# Altium integrated library Jesse_Library.IntLib: 1084 symbols (part 2 of 5) (continued)
## IC USBUF02W6 (continued)
USB ESD; Package: SOIC-8_150mil; Supplier: LC; SuppliersPartNumber: C9669; ComponentLink1Description: 立创商城链接; ComponentLink1URL: https://item.szlcsc.com/76058.html
footprint SOT23-6
pins: 1 D1, 2 GND, 3 D2, 4 D3, 5 VCC, 6 D4

## IC W25Q16JVSSIQ
designator U?, comment W25Q16JVSSIQ
Flash ROM; Package: SOIC-8; Supplier: LC; SuppliersPartNumber: C35101; ComponentLink1Description: 立创商城链接; ComponentLink1URL: https://item.szlcsc.com/83474.html
footprint SOIC8_208mil
pins: 1 ~{CS}, 2 DO, 3 ~{WP}, 4 GND, 5 DI, 6 CLK, 7 ~{HOLD} ro ~{RESET}, 8 VCC

## IC W25Q128FVSIG
designator U?
Flash ROM; ComponentLink1Description: 供应商链接; ComponentLink1URL: http://www.szlcsc.com/product/details_36072.html; Package: SOIC-8; Supplier: LC; SuppliersPartNumber: C35101
footprint SOIC8_208mil
pins: 1 ~{CS}, 2 DO, 3 ~{WP}, 4 GND, 5 DI, 6 CLK, 7 ~{HOLD} ro ~{RESET}, 8 VCC

## IC W5500
designator U?
以太网; ComponentLink1Description: 供应商链接; ComponentLink1URL: http://www.szlcsc.com/product/details_33808.html; Package: LQFP-48_7x7x05P; Supplier: LC; SuppliersPartNumber: C32843
footprint LQFP48 7x7
pins: 1 TXN, 2 TXP, 3 AGND, 4 AVDD, 5 RXN, 6 RXP, 7 DNC, 8 AVDD, 9 AGND, 10 EXRES1, 11 AVDD, 12 NC, 13 NC, 14 AGND, 15 AVDD, 16 AGND, 17 AVDD, 18 VBG, 19 AGND, 20 TOCAP, 21 AVDD, 22 1V2O, 23 RSVD, 24 SPDLED, 25 LINKLED, 26 DUPLED, 27 ACTLED, 28 VDD, 29 GND, 30 XI/CLCKIN, 31 XO, 32 SCSn, 33 SCLK, 34 MISO, 35 MOSI, 36 INTn, 37 RSTn, 38 RSVD, 39 RSVD, 40 RSVD, 41 RSVD, 42 RSVD, 43 PMODE2, 44 PMODE1, 45 PMODE0, 46 NC, 47 NC, 48 AGND

## IC XL1509-5.0E1
designator U?
DC-DC芯片; ComponentLink1Description: 供应商链接; ComponentLink1URL: http://www.szlcsc.com/product/details_62115.html; Package: SOP-8_150mil; Supplier: LC; SuppliersPartNumber: C61063
footprint SOP8_150mil
pins: 1 VIN , 2 OUTPUT , 3 FEEDBACK , 4 ON/OFF , 5  GND, 6  GND, 7 GND, 8 GND

## IC XL1509-ADJE1
designator U?
DC-DC芯片; ComponentLink1Description: 供应商链接; ComponentLink1URL: http://www.szlcsc.com/product/details_75311.html; Package: SOP-8_150mil; Supplier: LC; SuppliersPartNumber: C74192
footprint SOP8_150mil
pins: 1 VIN , 2 OUTPUT , 3 FEEDBACK , 4 ON/OFF , 5  GND, 6  GND, 7 GND, 8 GND

## IC XL6006E1
designator U?
LED升压型驱动; ComponentLink1Description: 供应商链接; ComponentLink1URL: http://www.szlcsc.com/product/details_10538.html; Package: TO-263-5; Supplier: LC; SuppliersPartNumber: C10002
footprint TO263-5A (263，5脚晶体管)
pins: 1 GND (power), 2 EN (power), 3 SW (power), 4 VIN (in), 5 FB


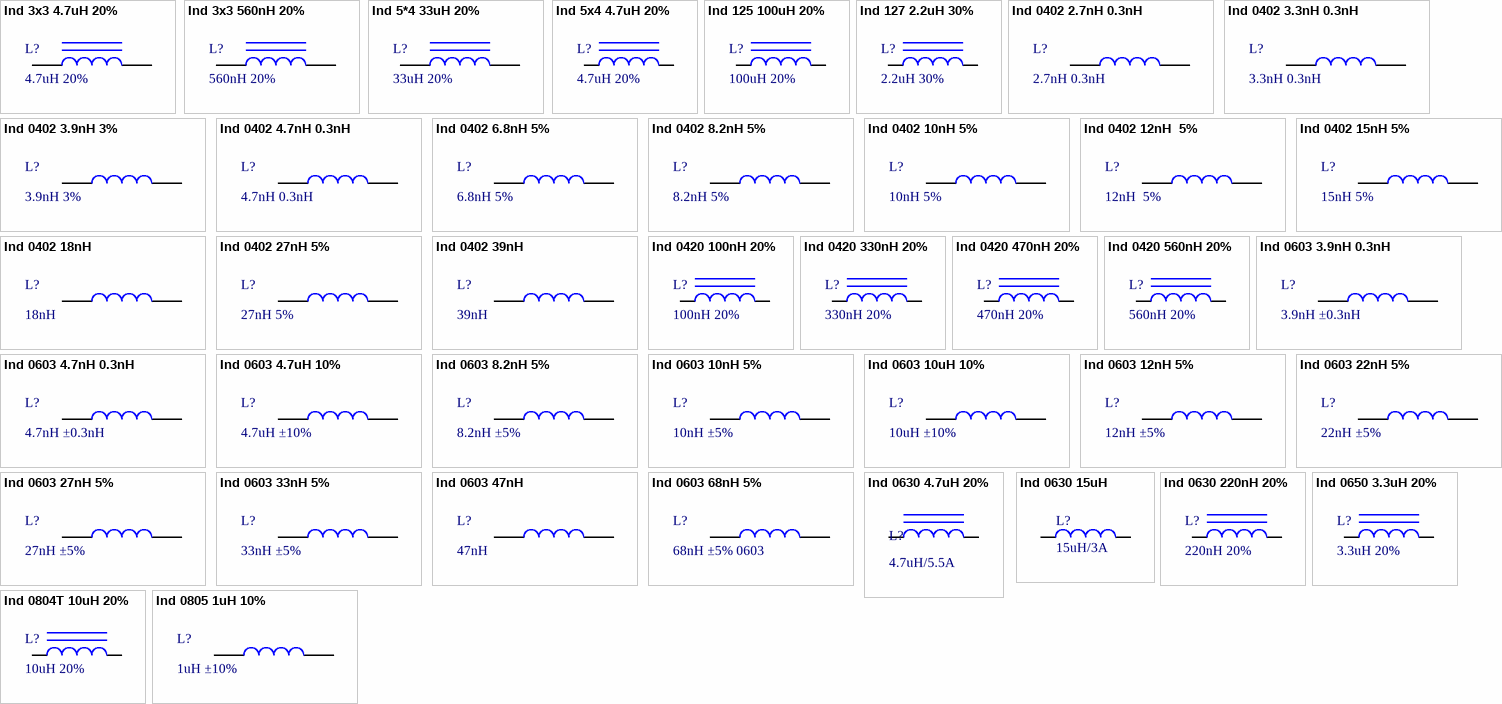
[diagram p20: symbols Ind 3x3 4.7uH 20% to Ind 0805 1uH 10%]

## Ind 3x3 4.7uH 20%
designator L?, comment 4.7uH 20%
贴片功率电感
footprint IND3x3
pins: 1, 2

## Ind 3x3 560nH 20%
designator L?, comment 560nH 20%
贴片功率电感
footprint IND3x3
pins: 1, 2

## Ind 5*4 33uH 20%
designator L?, comment 33uH 20%
贴片功率电感
footprint IND5X4
pins: 1, 2

## Ind 5x4 4.7uH 20%
designator L?, comment 4.7uH 20%
贴片功率电感
footprint IND5x4
pins: 1, 2

## Ind 125 100uH 20%
designator L?, comment 100uH 20%
贴片功率电感
footprint 1205_L (Footprint not found)
pins: 1, 2

## Ind 127 2.2uH 30%
designator L?, comment 2.2uH 30%
贴片功率电感
footprint 1207_L (Footprint not found)
pins: 1, 2

## Ind 0402 2.7nH 0.3nH
designator L?, comment 2.7nH 0.3nH
贴片电感; ComponentLink1Description: 供应商链接; ComponentLink1URL: http://www.szlcsc.com/product/details_27872.html; Package: 0402; Supplier: LC; SuppliersPartNumber: C27123
footprint 0402_L
pins: 1, 2

## Ind 0402 3.3nH 0.3nH
designator L?, comment 3.3nH 0.3nH
贴片电感; ComponentLink1Description: 供应商链接; ComponentLink1URL: http://www.szlcsc.com/product/details_27873.html; Package: 0402; Supplier: LC; SuppliersPartNumber: C27124
footprint 0402_L
pins: 1, 2

## Ind 0402 3.9nH 3%
designator L?, comment 3.9nH 3%
贴片电感; ComponentLink1Description: 供应商链接; ComponentLink1URL: http://www.szlcsc.com/product/details_14690.html; Package: 0402; Supplier: LC; SuppliersPartNumber: C14033
footprint 0402_L
pins: 1, 2

## Ind 0402 4.7nH 0.3nH
designator L?, comment 4.7nH 0.3nH
贴片电感; ComponentLink1Description: 供应商链接; ComponentLink1URL: http://www.szlcsc.com/product/details_14246.html; Package: 0402; Supplier: LC; SuppliersPartNumber: C13595
footprint 0402_L
pins: 1, 2

## Ind 0402 6.8nH 5%
designator L?, comment 6.8nH 5%
贴片电感; ComponentLink1Description: 供应商链接; ComponentLink1URL: http://www.szlcsc.com/product/details_33003.html; Package: 0402; Supplier: LC; SuppliersPartNumber: C32041
footprint 0402_L
pins: 1, 2

## Ind 0402 8.2nH 5%
designator L?, comment 8.2nH 5%
贴片电感; ComponentLink1Description: 供应商链接; ComponentLink1URL: http://www.szlcsc.com/product/details_16890.html; Package: 0402; Supplier: LC; SuppliersPartNumber: C16208
footprint 0402_L
pins: 1, 2

## Ind 0402 10nH 5%
designator L?, comment 10nH 5%
贴片电感; ComponentLink1Description: 供应商链接; ComponentLink1URL: http://www.szlcsc.com/product/details_27896.html; Package: 0402; Supplier: LC; SuppliersPartNumber: C27147
footprint 0402_L
pins: 1, 2

## Ind 0402 12nH  5%
designator L?, comment 12nH  5%
贴片电感; ComponentLink1Description: 供应商链接; ComponentLink1URL: http://www.szlcsc.com/product/details_25303.html; Package: 0402; Supplier: LC; SuppliersPartNumber: C24563
footprint 0402_L
pins: 1, 2

## Ind 0402 15nH 5%
designator L?, comment 15nH 5%
贴片电感; ComponentLink1Description: 供应商链接; ComponentLink1URL: http://www.szlcsc.com/product/details_27892.html; Package: 0402; Supplier: LC; SuppliersPartNumber: C27143
footprint 0402_L
pins: 1, 2

## Ind 0402 18nH
designator L?, comment 18nH
贴片电感; ComponentLink1Description: 供应商链接; ComponentLink1URL: http://www.szlcsc.com/product/details_25302.html; Package: 0402; Supplier: LC; SuppliersPartNumber: C24562
footprint 0402_L
pins: 1, 2

## Ind 0402 27nH 5%
designator L?, comment 27nH 5%
贴片电感; ComponentLink1Description: 供应商链接; ComponentLink1URL: http://www.szlcsc.com/product/details_19533.html; Package: 0402; Supplier: LC; SuppliersPartNumber: C18830
footprint 0402_L
pins: 1, 2

## Ind 0402 39nH
designator L?, comment 39nH
贴片电感; ComponentLink1Description: 供应商链接; ComponentLink1URL: http://www.szlcsc.com/product/details_27187.html; Package: 0402; Supplier: LC; SuppliersPartNumber: C26443
footprint 0402_L
pins: 1, 2

## Ind 0420 100nH 20%
designator L?, comment 100nH 20%
贴片功率电感
footprint 0420_L
pins: 1, 2

## Ind 0420 330nH 20%
designator L?, comment 330nH 20%
贴片功率电感
footprint 0420_L
pins: 1, 2

## Ind 0420 470nH 20%
designator L?, comment 470nH 20%
贴片功率电感
footprint 0420_L
pins: 1, 2

## Ind 0420 560nH 20%
designator L?, comment 560nH 20%
贴片功率电感
footprint 0420_L
pins: 1, 2

## Ind 0603 3.9nH 0.3nH
designator L?, comment 3.9nH ±0.3nH
贴片电感; ComponentLink1Description: 供应商链接; ComponentLink1URL: http://www.szlcsc.com/product/details_14473.html; Package: 0603; Supplier: LC; SuppliersPartNumber: C13818
footprint 0603_L
pins: 1, 2

## Ind 0603 4.7nH 0.3nH
designator L?, comment 4.7nH ±0.3nH
贴片电感; ComponentLink1Description: 供应商链接; ComponentLink1URL: http://www.szlcsc.com/product/details_1382.html; Package: 0603; Supplier: LC; SuppliersPartNumber: C1030
footprint 0603_L
pins: 1, 2

## Ind 0603 4.7uH 10%
designator L?, comment 4.7uH ±10%
贴片电感; ComponentLink1Description: 供应商链接; ComponentLink1URL: http://www.szlcsc.com/product/details_1386.html; Package: 0603; Supplier: LC; SuppliersPartNumber: C1034
footprint 0603_L
pins: 1, 2

## Ind 0603 8.2nH 5%
designator L?, comment 8.2nH ±5%
贴片电感; ComponentLink1Description: 供应商链接; ComponentLink1URL: http://www.szlcsc.com/product/details_1384.html; Package: 0603; Supplier: LC; SuppliersPartNumber: C1032
footprint 0603_L
pins: 1, 2

## Ind 0603 10nH 5%
designator L?, comment 10nH ±5%
贴片电感; ComponentLink1Description: 供应商链接; ComponentLink1URL: http://www.szlcsc.com/product/details_16347.html; Package: 0603; Supplier: LC; SuppliersPartNumber: C15666
footprint 0603_L
pins: 1, 2

## Ind 0603 10uH 10%
designator L?, comment 10uH ±10%
贴片电感; ComponentLink1Description: 供应商链接; ComponentLink1URL: http://www.szlcsc.com/product/details_1387.html; Package: 0603; Supplier: LC; SuppliersPartNumber: C1035
footprint 0603_L
pins: 1, 2

## Ind 0603 12nH 5%
designator L?, comment 12nH ±5%
贴片电感; ComponentLink1Description: 供应商链接; ComponentLink1URL: http://www.szlcsc.com/product/details_30010.html; Package: 0603; Supplier: LC; SuppliersPartNumber: C29258
footprint 0603_L
pins: 1, 2

## Ind 0603 22nH 5%
designator L?, comment 22nH ±5%
贴片电感; ComponentLink1Description: 供应商链接; ComponentLink1URL: http://www.szlcsc.com/product/details_12684.html; Package: 0603; Supplier: LC; SuppliersPartNumber: C12099
footprint 0603_L
pins: 1, 2

## Ind 0603 27nH 5%
designator L?, comment 27nH ±5%
贴片电感; ComponentLink1Description: 供应商链接; ComponentLink1URL: http://www.szlcsc.com/product/details_12685.html; Package: 0603; Supplier: LC; SuppliersPartNumber: C12100
footprint 0603_L
pins: 1, 2

## Ind 0603 33nH 5%
designator L?, comment 33nH ±5%
贴片电感; ComponentLink1Description: 供应商链接; ComponentLink1URL: http://www.szlcsc.com/product/details_36021.html; Package: 0603; Supplier: LC; SuppliersPartNumber: C35050
footprint 0603_L
pins: 1, 2

## Ind 0603 47nH
designator L?, comment 47nH
贴片电感; ComponentLink1Description: 供应商链接; ComponentLink1URL: http://www.szlcsc.com/product/details_30437.html; Package: 0603; Supplier: LC; SuppliersPartNumber: C29683
footprint 0603_L
pins: 1, 2

## Ind 0603 68nH 5%
designator L?, comment 68nH ±5% 0603
贴片电感; ComponentLink1Description: 供应商链接; ComponentLink1URL: http://www.szlcsc.com/product/details_14064.html; Package: 0603; Supplier: LC; SuppliersPartNumber: C13415
footprint 0603_L
pins: 1, 2

## Ind 0630 4.7uH 20%
designator L?, comment 4.7uH/5.5A
贴片电感; Code_IEC: 1005; Published: 8-Jun-2000; LatestRevisionDate: 29-May-2009; LatestRevisionNote: IPC-7351 Footprint Added.; PackageReference: 0402-A; Publisher: Altium Limited; PackageDescription: Chip Inductor; Code_JEITA: 0402
footprint 0630_L
pins: 1, 2

## Ind 0630 15uH
designator L?, comment 15uH/3A
贴片电感; Code_IEC: 1005; Published: 8-Jun-2000; LatestRevisionDate: 29-May-2009; LatestRevisionNote: IPC-7351 Footprint Added.; PackageReference: 0402-A; Publisher: Altium Limited; PackageDescription: Chip Inductor; Code_JEITA: 0402
footprint 0630_L
pins: 1, 2

## Ind 0630 220nH 20%
designator L?, comment 220nH 20%
贴片功率电感
footprint 0630_L
pins: 1, 2

## Ind 0650 3.3uH 20%
designator L?, comment 3.3uH 20%
贴片功率电感
footprint 0650_L
pins: 1, 2

## Ind 0804T 10uH 20%
designator L?, comment 10uH 20%
贴片功率电感
footprint 0804T_L (功率电感)
pins: 1, 2

## Ind 0805 1uH 10%
designator L?, comment 1uH ±10%
贴片电感; ComponentLink1Description: 供应商链接; ComponentLink1URL: http://www.szlcsc.com/product/details_1394.html; Package: 0805; Supplier: LC; SuppliersPartNumber: C1042
footprint 0805_L
pins: 1, 2

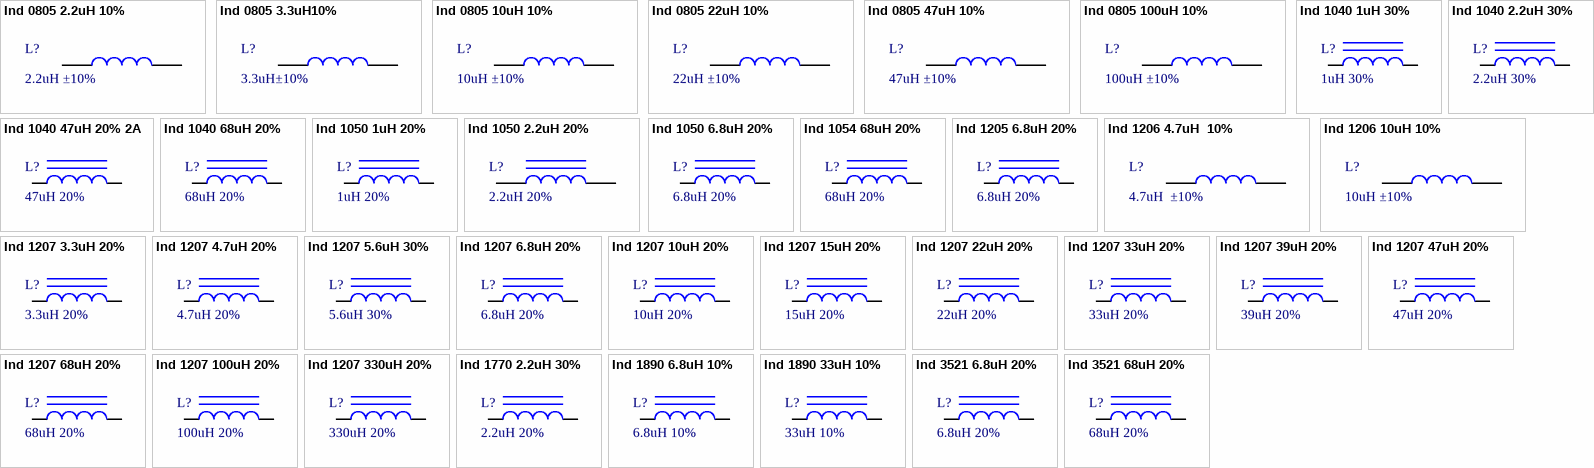
[diagram p21: symbols Ind 0805 2.2uH 10% to Ind 3521 68uH 20%]

## Ind 0805 2.2uH 10%
designator L?, comment 2.2uH ±10%
贴片电感; ComponentLink1Description: 供应商链接; ComponentLink1URL: http://www.szlcsc.com/product/details_1395.html; Package: 0805; Supplier: LC; SuppliersPartNumber: C1043
footprint 0805_L
pins: 1, 2

## Ind 0805 3.3uH10%
designator L?, comment 3.3uH±10%
贴片电感; ComponentLink1Description: 供应商链接; ComponentLink1URL: http://www.szlcsc.com/product/details_52738.html; Package: 0805; Supplier: LC; SuppliersPartNumber: C51725
footprint 0805_L
pins: 1, 2

## Ind 0805 10uH 10%
designator L?, comment 10uH ±10%
贴片电感; ComponentLink1Description: 供应商链接; ComponentLink1URL: http://www.szlcsc.com/product/details_1398.html; Package: 0805; Supplier: LC; SuppliersPartNumber: C1046
footprint 0805_L
pins: 1, 2

## Ind 0805 22uH 10%
designator L?, comment 22uH ±10%
贴片电感; ComponentLink1Description: 供应商链接; ComponentLink1URL: http://www.szlcsc.com/product/details_33340.html; Package: 0805; Supplier: LC; SuppliersPartNumber: C32375
footprint 0805_L
pins: 1, 2

## Ind 0805 47uH 10%
designator L?, comment 47uH ±10%
贴片电感; ComponentLink1Description: 供应商链接; ComponentLink1URL: http://www.szlcsc.com/product/details_14964.html; Package: 0805; Supplier: LC; SuppliersPartNumber: C14304
footprint 0805_L
pins: 1, 2

## Ind 0805 100uH 10%
designator L?, comment 100uH ±10%
贴片电感; ComponentLink1Description: 供应商链接; ComponentLink1URL: http://www.szlcsc.com/product/details_69137.html; Package: 0805; Supplier: LC; SuppliersPartNumber: C68035
footprint 0805_L
pins: 1, 2

## Ind 1040 1uH 30%
designator L?, comment 1uH 30%
贴片功率电感
footprint 1040_L
pins: 1, 2

## Ind 1040 2.2uH 30%
designator L?, comment 2.2uH 30%
贴片功率电感
footprint 1040_L
pins: 1, 2

## Ind 1040 47uH 20% 2A
designator L?, comment 47uH 20%
贴片功率电感
footprint 1040_L
pins: 1, 2

## Ind 1040 68uH 20%
designator L?, comment 68uH 20%
贴片功率电感
footprint 1040_L
pins: 1, 2

## Ind 1050 1uH 20%
designator L?, comment 1uH 20%
贴片功率电感
footprint 1050_L
pins: 1, 2

## Ind 1050 2.2uH 20%
designator L?, comment 2.2uH 20%
贴片功率电感
footprint 1050_L
pins: 1, 2

## Ind 1050 6.8uH 20%
designator L?, comment 6.8uH 20%
贴片功率电感
footprint 1050_L
pins: 1, 2

## Ind 1054 68uH 20%
designator L?, comment 68uH 20%
贴片功率电感
footprint 1054_L
pins: 1, 2

## Ind 1205 6.8uH 20%
designator L?, comment 6.8uH 20%
贴片功率电感
footprint 1205_L
pins: 1, 2

## Ind 1206 4.7uH  10%
designator L?, comment 4.7uH  ±10%
贴片电感; ComponentLink1Description: 供应商链接; ComponentLink1URL: http://www.szlcsc.com/product/details_1401.html; Package: 1206; Supplier: LC; SuppliersPartNumber: C1049
footprint 1206_L
pins: 1, 2

## Ind 1206 10uH 10%
designator L?, comment 10uH ±10%
贴片电感; ComponentLink1Description: 供应商链接; ComponentLink1URL: http://www.szlcsc.com/product/details_1403.html; Package: 1206; Supplier: LC; SuppliersPartNumber: C1051
footprint 1206_L
pins: 1, 2

## Ind 1207 3.3uH 20%
designator L?, comment 3.3uH 20%
贴片功率电感
footprint 1207_L
pins: 1, 2

## Ind 1207 4.7uH 20%
designator L?, comment 4.7uH 20%
贴片功率电感
footprint 1207_L
pins: 1, 2

## Ind 1207 5.6uH 30%
designator L?, comment 5.6uH 30%
贴片功率电感
footprint 1207_L
pins: 1, 2

## Ind 1207 6.8uH 20%
designator L?, comment 6.8uH 20%
贴片功率电感
footprint 1207_L
pins: 1, 2

## Ind 1207 10uH 20%
designator L?, comment 10uH 20%
贴片功率电感
footprint 1207_L
pins: 1, 2

## Ind 1207 15uH 20%
designator L?, comment 15uH 20%
贴片功率电感
footprint 1207_L
pins: 1, 2

## Ind 1207 22uH 20%
designator L?, comment 22uH 20%
贴片功率电感
footprint 1207_L
pins: 1, 2

## Ind 1207 33uH 20%
designator L?, comment 33uH 20%
贴片功率电感
footprint 1207_L
pins: 1, 2

## Ind 1207 39uH 20%
designator L?, comment 39uH 20%
贴片功率电感
footprint 1207_L
pins: 1, 2

## Ind 1207 47uH 20%
designator L?, comment 47uH 20%
贴片功率电感
footprint 1207_L
pins: 1, 2

## Ind 1207 68uH 20%
designator L?, comment 68uH 20%
贴片功率电感
footprint 1207_L
pins: 1, 2

## Ind 1207 100uH 20%
designator L?, comment 100uH 20%
贴片功率电感
footprint 1207_L
pins: 1, 2

## Ind 1207 330uH 20%
designator L?, comment 330uH 20%
贴片功率电感
footprint 1207_L
pins: 1, 2

## Ind 1770 2.2uH 30%
designator L?, comment 2.2uH 20%
贴片功率电感
footprint 1770_L
pins: 1, 2

## Ind 1890 6.8uH 10%
designator L?, comment 6.8uH 10%
贴片功率电感
footprint 1890_L (18X18)
pins: 1, 2

## Ind 1890 33uH 10%
designator L?, comment 33uH 10%
贴片功率电感
footprint 1890_L (18X18)
pins: 1, 2

## Ind 3521 6.8uH 20%
designator L?, comment 6.8uH 20%
贴片功率电感
footprint 3521_L
pins: 1, 2

## Ind 3521 68uH 20%
designator L?, comment 68uH 20%
贴片功率电感
footprint 3521_L
pins: 1, 2


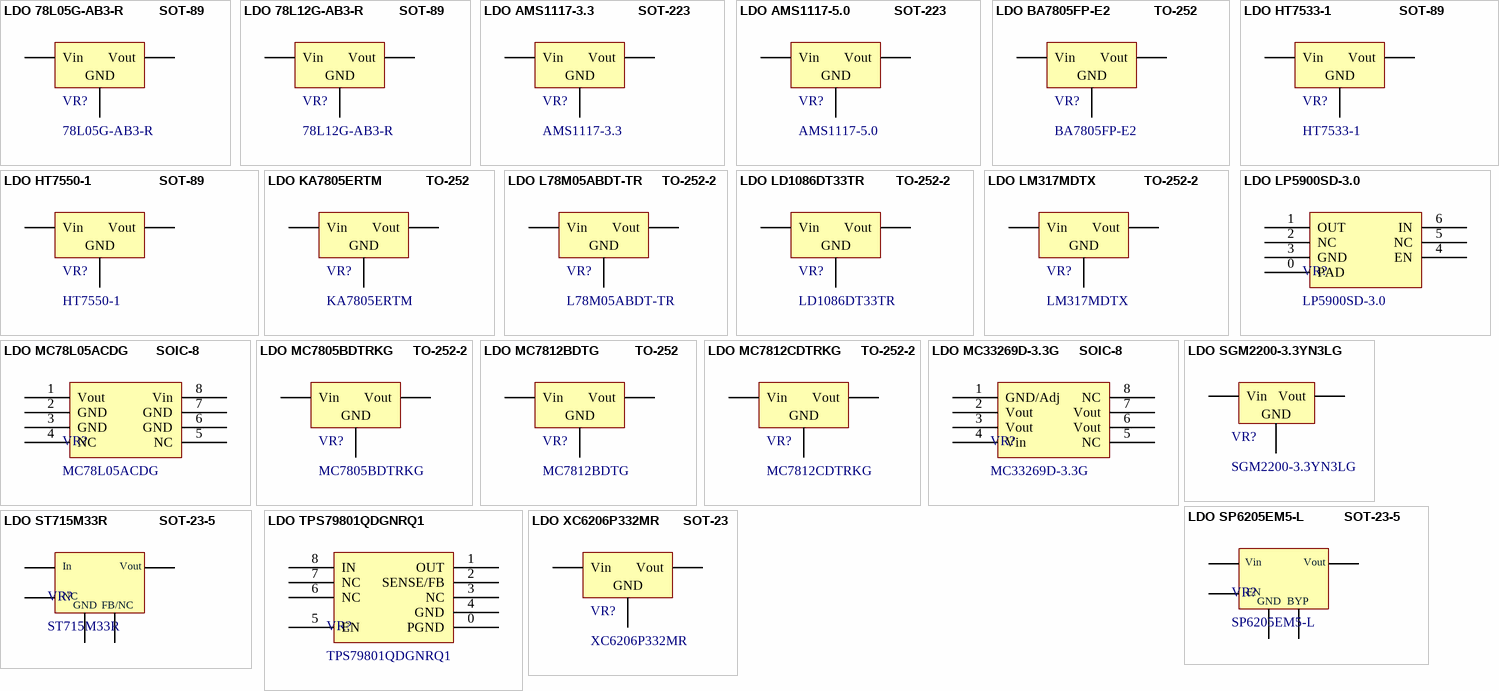
[diagram p22: symbols LDO 78L05G-AB3-R         SOT-89 to LDO XC6206P332MR      SOT-23]

## LDO 78L05G-AB3-R         SOT-89
designator VR?, comment 78L05G-AB3-R
低压差线性稳压(LDO); Package: SOT-89; Supplier: LC; SuppliersPartNumber: C71136; ComponentLink1Description: 立创商城链接; ComponentLink1URL: https://item.szlcsc.com/72235.html
footprint SOT89-3
pins: 1 Vout, 2 GND, 3 Vin

## LDO 78L12G-AB3-R         SOT-89
designator VR?, comment 78L12G-AB3-R
低压差线性稳压(LDO); Package: SOT-89; Supplier: LC; SuppliersPartNumber: C75501; ComponentLink1Description: 立创商城链接; ComponentLink1URL: https://item.szlcsc.com/76626.html
footprint SOT89-3
pins: 1 Vout, 2 GND, 3 Vin

## LDO AMS1117-3.3           SOT-223
designator VR?, comment AMS1117-3.3
低压差线性稳压(LDO); Package: SOT-223; Supplier: LC; SuppliersPartNumber: C6186; ComponentLink1Description: 立创商城链接; ComponentLink1URL: https://item.szlcsc.com/6652.html
footprint SOT223
pins: 1 GND, 2 Vout, 3 Vin

## LDO AMS1117-5.0           SOT-223
designator VR?, comment AMS1117-5.0
低压差线性稳压(LDO); Package: SOT-223; Supplier: LC; SuppliersPartNumber: C6187; ComponentLink1Description: 立创商城链接; ComponentLink1URL: https://item.szlcsc.com/6653.html
footprint SOT223
pins: 1 GND, 2 Vout, 3 Vin

## LDO BA7805FP-E2           TO-252
designator VR?, comment BA7805FP-E2
低压差线性稳压(LDO); Package: SOT-89; Supplier: LC; SuppliersPartNumber: C71136; ComponentLink1Description: 立创商城链接; ComponentLink1URL: https://item.szlcsc.com/80782.html
footprint TO252 (252晶体管)
pins: 1 Vin, 2 GND, 3 Vout

## LDO HT7533-1                 SOT-89
designator VR?, comment HT7533-1
低压差线性稳压(LDO); Package: SOT-89; Supplier: LC; SuppliersPartNumber: C14289; ComponentLink1Description: 立创商城链接; ComponentLink1URL: https://item.szlcsc.com/14949.html
footprint SOT89-3
pins: 1 GND, 2 Vin, 3 Vout

## LDO HT7550-1                 SOT-89
designator VR?, comment HT7550-1
低压差线性稳压(LDO); Package: SOT-89; Supplier: LC; SuppliersPartNumber: C16106; ComponentLink1Description: 立创商城链接; ComponentLink1URL: https://item.szlcsc.com/16788.html
footprint SOT89-3
pins: 1 GND, 2 Vin, 3 Vout

## LDO KA7805ERTM           TO-252
designator VR?, comment KA7805ERTM
低压差线性稳压(LDO); Package: SOT-89; Supplier: LC; SuppliersPartNumber: C71136; ComponentLink1Description: 立创商城链接; ComponentLink1URL: https://item.szlcsc.com/250123.html
footprint TO252 (252晶体管)
pins: 1 Vin, 2 GND, 3 Vout

## LDO L78M05ABDT-TR     TO-252-2
designator VR?, comment L78M05ABDT-TR
低压差线性稳压(LDO); Package: TO-252-2; Supplier: LC; SuppliersPartNumber: C58069; ComponentLink1Description: 立创商城链接; ComponentLink1URL: https://item.szlcsc.com/59107.html
footprint TO252 (252晶体管)
pins: 1 Vin, 2 GND, 3 Vout

## LDO LD1086DT33TR        TO-252-2
designator VR?, comment LD1086DT33TR
低压差线性稳压(LDO); Package: TO-252-2; Supplier: LC; SuppliersPartNumber: C75510; ComponentLink1Description: 立创商城链接; ComponentLink1URL: https://item.szlcsc.com/12615.html
footprint TO252 (252晶体管)
pins: 1 GND, 2 Vout, 3 Vin

## LDO LM317MDTX            TO-252-2
designator VR?, comment LM317MDTX
低压差线性稳压(LDO); Package: TO-252-2; Supplier: LC; SuppliersPartNumber: C75510; ComponentLink1Description: 立创商城链接; ComponentLink1URL: https://item.szlcsc.com/232561.html
footprint TO252 (252晶体管)
pins: 1 GND, 2 Vout, 3 Vin

## LDO LP5900SD-3.0
designator VR?, comment LP5900SD-3.0
低压差线性稳压(LDO); Package: SOT-23; Supplier: LC; SuppliersPartNumber: C5446
footprint WSON6 2.5X2.2
pins: 0 PAD, 1 OUT (power), 2 NC, 3 GND, 4 EN, 5 NC, 6 IN

## LDO MC78L05ACDG       SOIC-8
designator VR?, comment MC78L05ACDG
低压差线性稳压器(LDO); ComponentLink1Description: 立创商城链接; ComponentLink1URL: https://item.szlcsc.com/232528.html
footprint SOIC8_150mil
pins: 1 Vout, 2 GND, 3 GND, 4 NC, 5 NC, 6 GND, 7 GND, 8 Vin

## LDO MC7805BDTRKG     TO-252-2
designator VR?, comment MC7805BDTRKG
低压差线性稳压(LDO); Package: TO-252-2; Supplier: LC; SuppliersPartNumber: C58069; ComponentLink1Description: 立创商城链接; ComponentLink1URL: https://item.szlcsc.com/112133.html
footprint TO252 (252晶体管)
pins: 1 Vin, 2 GND, 3 Vout

## LDO MC7812BDTG         TO-252
designator VR?, comment MC7812BDTG
低压差线性稳压(LDO); Package: TO-252-2; Supplier: LC; SuppliersPartNumber: C58069; ComponentLink1Description: 立创商城链接; ComponentLink1URL: https://item.szlcsc.com/233103.html
footprint TO252 (252晶体管)
pins: 1 Vin, 2 GND, 3 Vout

## LDO MC7812CDTRKG     TO-252-2
designator VR?, comment MC7812CDTRKG
低压差线性稳压(LDO); Package: TO-252-2; Supplier: LC; SuppliersPartNumber: C58069; ComponentLink1Description: 立创商城链接; ComponentLink1URL: https://item.szlcsc.com/114773.html
footprint TO252 (252晶体管)
pins: 1 Vin, 2 GND, 3 Vout

## LDO MC33269D-3.3G     SOIC-8
designator VR?, comment MC33269D-3.3G
低压差线性稳压器(LDO); ComponentLink1Description: 立创商城链接; ComponentLink1URL: https://item.szlcsc.com/232276.html
footprint SOIC8_150mil
pins: 1 GND/Adj, 2 Vout, 3 Vout, 4 Vin, 5 NC, 6 Vout, 7 Vout, 8 NC

## LDO SGM2200-3.3YN3LG
designator VR?, comment SGM2200-3.3YN3LG
低压差线性稳压(LDO); Package: SOT-23; Supplier: LC; SuppliersPartNumber: C5446; ComponentLink1Description: 立创商城链接; ComponentLink1URL: https://item.szlcsc.com/82078.html
footprint SOT23-3
pins: 1 GND, 2 Vout, 3 Vin

## LDO SP6205EM5-L          SOT-23-5
designator VR?, comment SP6205EM5-L
低压差线性稳压器(LDO); ComponentLink1Description: 立创商城链接; ComponentLink1URL: https://item.szlcsc.com/82723.html
footprint SOT23-5
pins: 1 Vin, 2  GND, 3 EN, 4 BYP, 5 Vout

## LDO ST715M33R             SOT-23-5
designator VR?, comment ST715M33R
低压差线性稳压器(LDO); ComponentLink1Description: 立创商城链接; ComponentLink1URL: https://item.szlcsc.com/110132.html
footprint SOT23-5
pins: 1 FB/NC, 2  GND, 3 NC, 4 IN, 5 Vout
text: In

## LDO TPS79801QDGNRQ1
designator VR?, comment TPS79801QDGNRQ1
低压差线性稳压器(LDO); ComponentLink1Description: 立创商城链接; ComponentLink1URL: https://item.szlcsc.com/140631.html
footprint TSSOP8 3X3_150Mil
pins: 0 PGND, 1 OUT, 2 SENSE/FB, 3 NC, 4 GND, 5 EN, 6 NC, 7 NC, 8 IN

## LDO XC6206P332MR      SOT-23
designator VR?, comment XC6206P332MR
低压差线性稳压(LDO); Package: SOT-23; Supplier: LC; SuppliersPartNumber: C5446; ComponentLink1Description: 立创商城链接; ComponentLink1URL: https://item.szlcsc.com/324036.html
footprint SOT23-3L (http://www.aosmd.com/res/packaging_information/SOT-23-3L.pdf)
pins: 1 GND, 2 Vout, 3 Vin


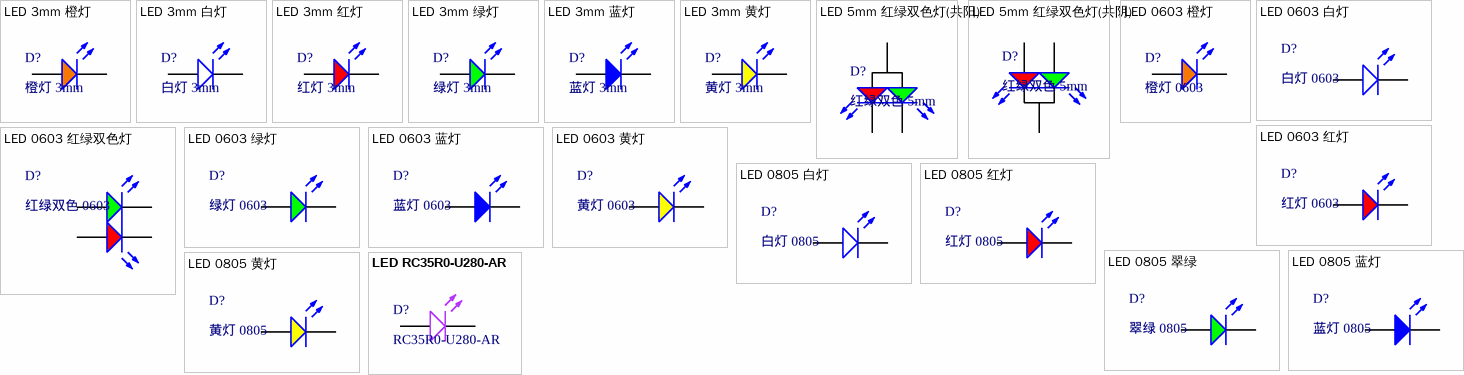
[diagram p23: symbols LED 3mm 橙灯 to LED RC35R0-U280-AR]

## LED 3mm 橙灯
designator D?, comment 橙灯 3mm
3mm直插发光二极管
footprint LED3-YEL
pins: A, K

## LED 3mm 白灯
designator D?, comment 白灯 3mm
3mm直插发光二极管
footprint LED 3mm
pins: A, K

## LED 3mm 红灯
designator D?, comment 红灯 3mm
3mm直插发光二极管
footprint LED3-RED
pins: A, K

## LED 3mm 绿灯
designator D?, comment 绿灯 3mm
3mm直插发光二极管
footprint LED3-GRE
pins: A, K

## LED 3mm 蓝灯
designator D?, comment 蓝灯 3mm
3mm直插发光二极管
footprint LED3-BLUE
pins: A, K

## LED 3mm 黄灯
designator D?, comment 黄灯 3mm
3mm直插发光二极管
footprint LED3-YEL
pins: A, K

## LED 5mm 红绿双色灯(共阳)
designator D?, comment 红绿双色 5mm
直插发光二极管; ComponentLink1Description: 供应商链接; ComponentLink1URL: http://www.szlcsc.com/product/details_73152.html; Package: 0603; Supplier: LC; SuppliersPartNumber: C72043
footprint RED&GREEN_LED
pins: 1, 2, 3

## LED 5mm 红绿双色灯(共阴)
designator D?, comment 红绿双色 5mm
直插发光二极管; Package: 0603; Supplier: LC; SuppliersPartNumber: C72043
footprint RED&GREEN_LED
pins: 1, 2, 3

## LED 0603 橙灯
designator D?, comment 橙灯 0603
贴片发光二极管
footprint LED 0603ORANGE
pins: A, K

## LED 0603 白灯
designator D?, comment 白灯 0603
贴片发光二极管; ComponentLink1Description: 供应商链接; ComponentLink1URL: http://www.szlcsc.com/product/details_2663.html; Package: 0603; Supplier: LC; SuppliersPartNumber: C2290
footprint LED 0603WHITE
pins: A, K

## LED 0603 红灯
designator D?, comment 红灯 0603
贴片发光二极管; ComponentLink1Description: 供应商链接; ComponentLink1URL: http://www.szlcsc.com/product/details_2659.html; Package: 0603; Supplier: LC; SuppliersPartNumber: C2286
footprint LED 0603RED
pins: A, K

## LED 0603 红绿双色灯
designator D?, comment 红绿双色 0603
贴片发光二极管; Package: 0603; Supplier: LC; SuppliersPartNumber: C72043; ComponentLink1Description: 立创商城链接; ComponentLink1URL: https://item.szlcsc.com/142555.html
footprint LED 0603RED&GRE
pins: 1, 2, 3, 4

## LED 0603 绿灯
designator D?, comment 绿灯 0603
贴片发光二极管; ComponentLink1Description: 供应商链接; ComponentLink1URL: http://www.szlcsc.com/product/details_73152.html; Package: 0603; Supplier: LC; SuppliersPartNumber: C72043
footprint LED 0603GREEN
pins: A, K

## LED 0603 蓝灯
designator D?, comment 蓝灯 0603
贴片发光二极管; ComponentLink1Description: 供应商链接; ComponentLink1URL: http://www.szlcsc.com/product/details_73150.html; Package: 0603; Supplier: LC; SuppliersPartNumber: C72041
footprint LED 0603GREEN
pins: A, K

## LED 0603 黄灯
designator D?, comment 黄灯 0603
贴片发光二极管; ComponentLink1Description: 供应商链接; ComponentLink1URL: http://www.szlcsc.com/product/details_73147.html; Package: 0603; Supplier: LC; SuppliersPartNumber: C72038
footprint LED 0603YELLOW
pins: A, K

## LED 0805 白灯
designator D?, comment 白灯 0805
贴片发光二极管; ComponentLink1Description: 供应商链接; ComponentLink1URL: http://www.szlcsc.com/product/details_35468.html; Package: 0805; Supplier: LC; SuppliersPartNumber: C34499
footprint LED 0805WHITE (1/8W)
pins: A, K